# Altium footprint library DipComponent.PcbLib: 303 footprints (part 15 of 19)
Each footprint in its own frame and in the unit in brackets; x right, y up, seen from the top. Pads: shape width x height; smd on the part's side, far side on the other; paste and mask are expansions set on the pad; w line width, h text height; cw(c..) or ccw(c..) is an arc to the next point about the centre after c.
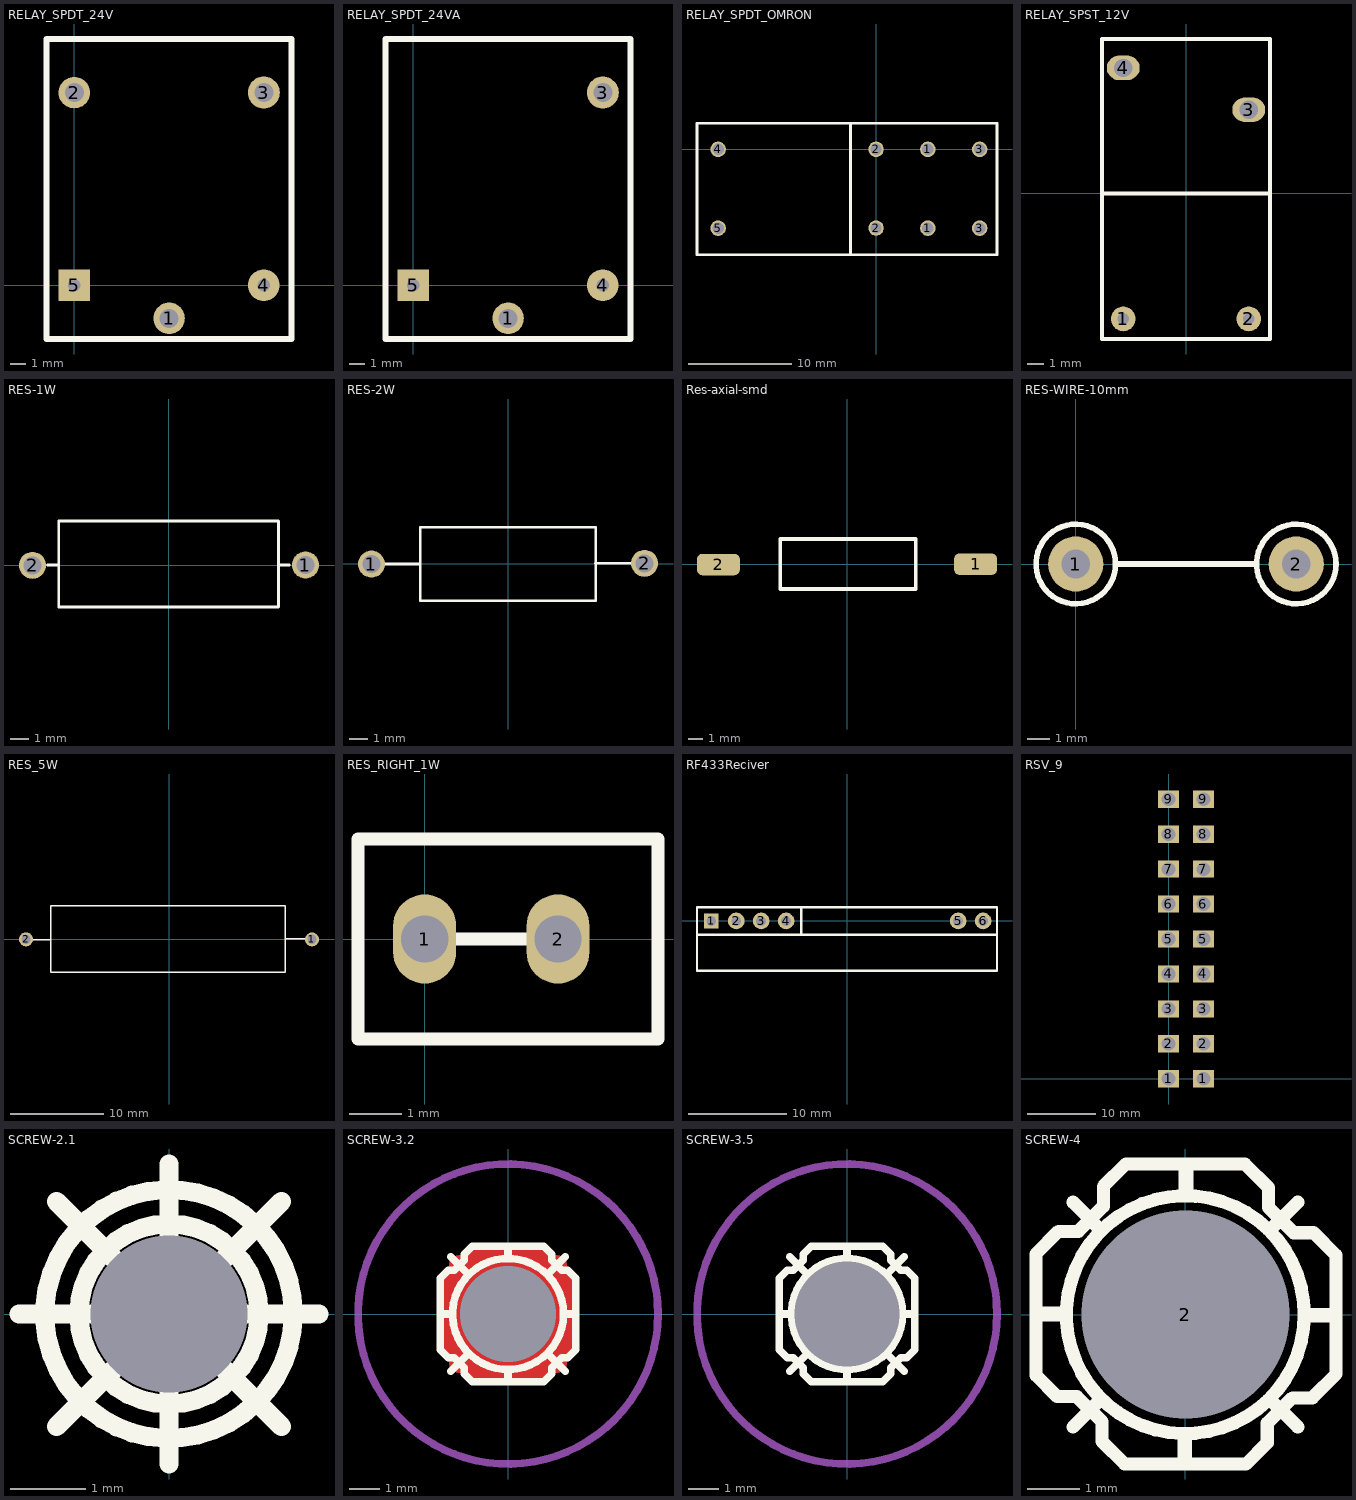
[diagram p14: the footprints below, top view; thin cyan lines are the x and y axes]

## RELAY_SPDT_24V [mm] "HKE"
pads (5):
  round 2 hole 1.2: 1(6,-2.1) 2(0,12.2)
  round 2.032 hole 1.2: 3(12,12.2)
  round 2 hole 0.8: 4(12,0)
  rect 2x2 hole 0.8: 5(0,0)
Top Overlay:
  lines w0.381: -1.756,-3.408 -1.756,15.592 13.744,15.592 13.744,-3.408 -1.756,-3.408
3D body "Tianbo Relay ( HJR-3FF-S-Z).step": height 15.51, standoff -2.2, extent -1.756,-3.408 13.744,15.592

## RELAY_SPDT_24VA [mm] "HKE"
pads (4):
  round 2 hole 1.2: 1(6,-2.1)
  round 2.032 hole 1.2: 3(12,12.2)
  round 2 hole 0.8: 4(12,0)
  rect 2x2 hole 0.8: 5(0,0)
Top Overlay:
  lines w0.381: -1.756,-3.408 -1.756,15.592 13.744,15.592 13.744,-3.408 -1.756,-3.408
3D body "Tianbo Relay ( HJR-3FF-S-Z).step": height 15.51, standoff -2.2, extent -1.756,-3.408 13.744,15.592

## RELAY_SPDT_OMRON [mm] "6 bin book"
pads (8):
  round 1.5 hole 1.1: 1(5,-7.61) 1(5,-0.01) 2(0,-7.6) 2(0,0) 3(10,-7.61) 3(10,-0.01) 4(-15.249,-0.01) 5(-15.249,-7.61)
Top Overlay:
  lines w0.254: -2.74,-10.183 -2.461,-10.183 -2.461,2.517 ; -17.281,-10.183 -17.281,2.517 11.675,2.517 11.675,-10.183 -17.281,-10.183
3D body "OMRON G2R-2 RELAY.STEP": height 25.96, standoff -4.01, extent -17.281,-10.208 11.675,2.517

## RELAY_SPST_12V [mm] "mini-10x18x14.5"
pads (4):
  round 1.5 hole 0.7: 1(-3.81,-7.62) 2(3.81,-7.62)
  oval 2x1.5 hole 1.1: 3(3.81,5.08) 4(-3.81,7.62)
Top Overlay:
  lines w0.254: -5.105,0 5.105,0 ; -5.105,-8.839 -5.105,9.373 5.105,9.373 5.105,-8.839 -5.105,-8.839
3D body "SPST-T77.stp": height 14.6, standoff -4.1, extent -5.1,-8.821 5.1,9.38

## RES-1W [mm]
pads (2):
  round 1.5 hole 1: 1(7.58,0.009) 2(-7.58,-0.009)
Top Overlay:
  lines w0.15: -6.751,0.009 -6.12,0.009 ; 6.08,0.009 6.68,0.009 ; -6.12,-2.326 6.08,-2.326 6.08,2.455 -6.12,2.455 -6.12,-2.326
3D body "User Library-RES-1W.STEP": height 5, standoff -3, extent -7.99,-2.491 7.95,2.509

## RES-2W [mm]
pads (2):
  round 1.5 hole 1: 1(-7.594,-0.02) 2(7.594,0.02)
Top Overlay:
  lines w0.15: -7.594,-0.02 -4.923,-0.02 ; 4.86,0.027 7.594,0.02 ; -4.886,-2.069 -4.886,2.035 4.876,2.035 4.876,-2.069 -4.886,-2.069
3D body "User Library-Resistor_Carvao_2W.STEP": height 4.2, standoff -3.8, extent -8.041,-2.009 7.999,1.991

## Res-axial-smd [mm]
pads (2):
  rrect50% 3x1.5 smd: 1(9,0.013) 2(-9,-0.013)
Top Overlay:
  lines w0.254: -4.674,-1.727 -4.674,1.778 4.801,1.778 4.801,-1.727 -4.674,-1.727
3D body "Res50-Axial 0_5W-560R.step": height 4.38, standoff -5, extent -6.649,-1.875 6.801,1.875

## RES-WIRE-10mm [mm]
pads (2):
  round 2.5 hole 1.3: 1(0,0) 2(10,0)
Top Overlay:
  circle w0.254: c0,0 r1.803
  circle w0.254: c10,0 r1.803
  lines w0.254: 1.803,0 8.204,0

## RES_5W [mm]
pads (2):
  round 1.5 hole 1: 1(15.275,-0.004) 2(-15.275,0.004)
Top Overlay:
  lines w0.15: -15.275,0.004 -15.275,-0.027 -12.644,-0.027 ; 12.395,-3.519 -12.653,-3.519 -12.653,3.599 12.395,3.599 12.395,-3.512 ; 12.424,0.045 15.275,0.045 15.275,-0.004
3D body "SW3dPS-5w wid.STEP": height 7.95, standoff -3.25, extent -15.627,-3.474 15.653,3.526

## RES_RIGHT_1W [mm]
pads (2):
  oval 1.2x1.7 hole 0.9: 1(0,0) 2(2.54,0)
Top Overlay:
  lines w0.254: 0,0 2.54,0 ; -1.27,-1.905 4.445,-1.905 4.445,1.905 -1.27,1.905 -1.27,-1.905
3D body "1W right 100mil.step": height 14.83, standoff -2.23, extent -0.301,-1.9 4.44,1.9

## RF433Reciver [mm]
pads (6):
  rect 1.5x1.5 hole 1: 1(-13.85,0)
  round 1.7 hole 1: 2(-11.31,0) 3(-8.77,0) 4(-6.23,0) 5(11.31,0) 6(13.85,0)
Top Overlay:
  lines w0.254: -15.309,-1.397 15.272,-1.397 ; -4.667,-1.397 -4.667,1.346 ; -15.309,-5.08 15.272,-5.08 15.272,1.397 -15.309,1.397 -15.309,1.194 -15.309,-5.08
3D body "rfModule_my.step": height 8.8, standoff -5.5, extent -15.145,-7.688 15.095,0.337

## RSV_9 [mm]
pads (18):
  rect 3x2.5 hole 2: 1(0,0) 1(5.08,0) 2(0,5.08) 2(5.08,5.08) 3(0,10.16) 3(5.08,10.16) 4(0,15.24) 4(5.08,15.24) 5(0,20.32) 5(5.08,20.32) 6(0,25.4) 6(5.08,25.4) 7(0,30.48) 7(5.08,30.48) 8(0,35.56) 8(5.08,35.56) 9(0,40.64) 9(5.08,40.64)

## SCREW-2.1 [mm]
pads (1):
  round 0 hole 2.1 unplated: 1(0,0)
Top Overlay:
  circle w0.254: c0,0 r1.657
  circle w0.254: c0,0 r1.201
  lines w0.254: -2,0 2,0 ; -1.5,-1.5 1.5,1.5 ; -1.5,1.5 1.5,-1.5 ; 0,-2 0,2
Bottom Overlay:
  circle w0.254: c0,0 r1.201
  circle w0.254: c0,0 r1.657
  lines w0.254: -2,0 2,0 ; -1.5,-1.5 1.5,1.5 ; -1.5,1.5 1.5,-1.5 ; 0,-2 0,2

## SCREW-3.2 [mm]
height 1.35
pads (1):
  round 0 hole 3.2: 1(0,0)
Top Layer:
  pour cut-out: -1.194,-2.261 1.194,-2.261 1.46,-1.994 1.905,-1.905 1.994,-1.46 2.261,-1.194 2.261,1.194 1.994,1.46 1.905,1.905 1.46,1.994 1.194,2.261 -1.194,2.261 -1.46,1.994 -1.905,1.905 -1.994,1.46 -2.261,1.194 -2.261,-1.194 -1.994,-1.46 -1.905,-1.905 -1.46,-1.994
Bottom Layer:
  pour cut-out: -1.194,-2.261 1.194,-2.261 1.46,-1.994 1.905,-1.905 1.994,-1.46 2.261,-1.194 2.261,1.194 1.994,1.46 1.905,1.905 1.46,1.994 1.194,2.261 -1.194,2.261 -1.46,1.994 -1.905,1.905 -1.994,1.46 -2.261,1.194 -2.261,-1.194 -1.994,-1.46 -1.905,-1.905 -1.46,-1.994
Top Overlay:
  circle w0.254: c0,0 r1.852
  lines w0.254: -1.905,-1.905 -1.321,-1.321 ; -1.905,1.905 -1.321,1.321 ; 1.321,-1.321 1.905,-1.905 ; 1.321,1.321 1.905,1.905 ; -2.261,0 -2.261,-1.194 -1.994,-1.46 -1.791,-1.46 -1.46,-1.791 -1.46,-1.994 -1.194,-2.261 0,-2.261 ; -2.261,0 -1.854,0 -2.261,0 ; -2.261,0 -2.261,1.194 -1.994,1.46 -1.791,1.46 -1.46,1.791 -1.46,1.994 -1.194,2.261 0,2.261 ; 0,-2.261 1.194,-2.261 1.46,-1.994 1.46,-1.791 1.791,-1.46 1.994,-1.46 2.261,-1.194 2.261,0 ; 0,-2.261 0,-1.854 0,-2.261 ; 0,2.261 1.194,2.261 1.46,1.994 1.46,1.791 1.791,1.46 1.994,1.46 2.261,1.194 2.261,0 ; 0,2.261 0,1.854 0,2.261 ; 2.261,0 1.854,0 2.261,0
Mechanical 15:
  circle w0.254: c0,0 r5
3D body "DLSP-1-3.STEP": height 4, standoff -8.8, extent -2.994,-2.997 2.994,2.997

## SCREW-3.5 [mm]
height 1.35
pads (1):
  round 0 hole 3.5 unplated: 1(0,0)
Top Overlay:
  circle w0.254: c0,0 r1.852
  lines w0.254: -1.905,-1.905 -1.321,-1.321 ; -1.905,1.905 -1.321,1.321 ; 1.321,-1.321 1.905,-1.905 ; 1.321,1.321 1.905,1.905 ; -2.261,0 -2.261,-1.194 -1.994,-1.46 -1.791,-1.46 -1.46,-1.791 -1.46,-1.994 -1.194,-2.261 0,-2.261 ; -2.261,0 -1.854,0 -2.261,0 ; -2.261,0 -2.261,1.194 -1.994,1.46 -1.791,1.46 -1.46,1.791 -1.46,1.994 -1.194,2.261 0,2.261 ; 0,-2.261 1.194,-2.261 1.46,-1.994 1.46,-1.791 1.791,-1.46 1.994,-1.46 2.261,-1.194 2.261,0 ; 0,-2.261 0,-1.854 0,-2.261 ; 0,2.261 1.194,2.261 1.46,1.994 1.46,1.791 1.791,1.46 1.994,1.46 2.261,1.194 2.261,0 ; 0,2.261 0,1.854 0,2.261 ; 2.261,0 1.854,0 2.261,0
Bottom Overlay:
  circle w0.254: c0,0 r1.852
  lines w0.254: -1.905,-1.905 -1.321,-1.321 ; -1.905,1.905 -1.321,1.321 ; 1.321,-1.321 1.905,-1.905 ; 1.321,1.321 1.905,1.905 ; -2.261,0 -1.854,0 -2.261,0 ; -2.261,0 -2.261,1.194 -1.994,1.46 -1.791,1.46 -1.46,1.791 -1.46,1.994 -1.194,2.261 0,2.261 ; -2.261,0 -2.261,-1.194 -1.994,-1.46 -1.791,-1.46 -1.46,-1.791 -1.46,-1.994 -1.194,-2.261 0,-2.261 ; 0,-2.261 0,-1.854 0,-2.261 ; 0,-2.261 1.194,-2.261 1.46,-1.994 1.46,-1.791 1.791,-1.46 1.994,-1.46 2.261,-1.194 2.261,0 ; 0,2.261 1.194,2.261 1.46,1.994 1.46,1.791 1.791,1.46 1.994,1.46 2.261,1.194 2.261,0 ; 0,2.261 0,1.854 0,2.261 ; 2.261,0 1.854,0 2.261,0
Mechanical 15:
  circle w0.254: c0,0 r5

## SCREW-4 [mm]
pads (1):
  round 1.5 hole 4: 2(0,0)
Top Overlay:
  circle w0.254: c0,0 r2.286
  lines w0.254: -2.311,0.025 -2.87,0.025 -2.87,-1.168 -2.464,-1.575 -2.083,-1.575 -1.6,-2.057 -1.6,-2.438 -1.168,-2.87 0,-2.87 0,-2.286 ; -2.286,0 -2.87,0 -2.87,1.168 -2.438,1.6 -2.057,1.6 -1.575,2.083 -1.575,2.464 -1.143,2.896 0.025,2.896 0.025,2.311 ; -2.159,-2.159 -1.626,-1.626 ; -2.159,2.159 -1.626,1.626 ; -0.025,-2.311 -0.025,-2.87 1.168,-2.87 1.575,-2.464 1.575,-2.083 2.057,-1.6 2.438,-1.6 2.896,-1.143 2.896,0 2.286,0 ; 0,2.286 0,2.896 1.143,2.896 1.6,2.438 1.6,2.057 2.083,1.575 2.464,1.575 2.896,1.143 2.896,-0.025 2.311,-0.025 ; 1.626,-1.626 2.159,-2.159 ; 1.626,1.626 2.159,2.159